# Altium footprint library texas.PCBLIB: 124 footprints (part 9 of 12)
Each footprint in its own frame and in the unit in brackets; x right, y up, seen from the top. Pads: shape width x height; smd on the part's side, far side on the other; paste and mask are expansions set on the pad; w line width, h text height; cw(c..) or ccw(c..) is an arc to the next point about the centre after c.
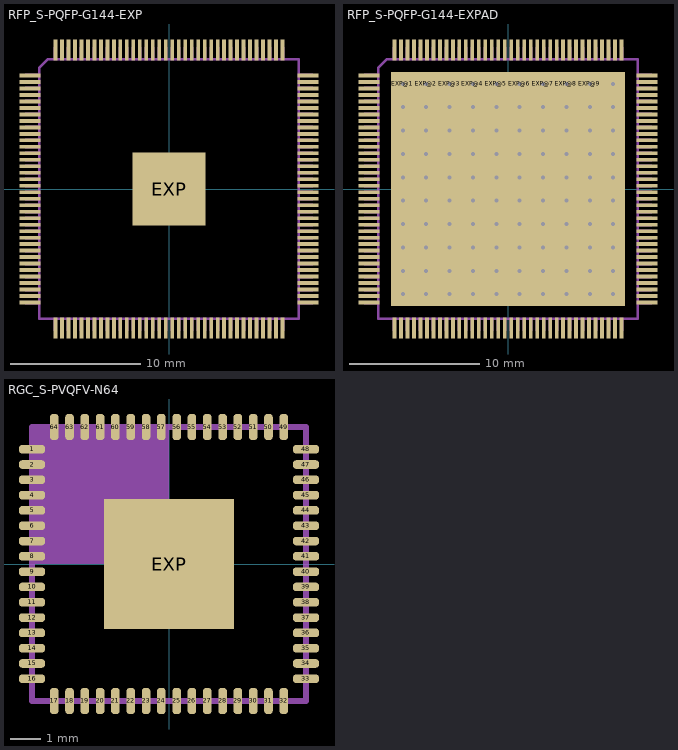
[diagram p8: the footprints below, top view; thin cyan lines are the x and y axes]

## RFP_S-PQFP-G144-EXP [mm]
pads (145):
  rect 1.6x0.3 smd paste-0.8 mask-0.8: 1(-10.7,8.75) 2(-10.7,8.25) 3(-10.7,7.75) 4(-10.7,7.25) 5(-10.7,6.75) 6(-10.7,6.25) 7(-10.7,5.75) 8(-10.7,5.25) 9(-10.7,4.75) 10(-10.7,4.25) 11(-10.7,3.75) 12(-10.7,3.25) 13(-10.7,2.75) 14(-10.7,2.25) 15(-10.7,1.75) 16(-10.7,1.25) 17(-10.7,0.75) 18(-10.7,0.25) 19(-10.7,-0.25) 20(-10.7,-0.75) 21(-10.7,-1.25) 22(-10.7,-1.75) 23(-10.7,-2.25) 24(-10.7,-2.75) 25(-10.7,-3.25) 26(-10.7,-3.75) 27(-10.7,-4.25) 28(-10.7,-4.75) 29(-10.7,-5.25) 30(-10.7,-5.75) 31(-10.7,-6.25) 32(-10.7,-6.75) 33(-10.7,-7.25) 34(-10.7,-7.75) 35(-10.7,-8.25) 36(-10.7,-8.75) 73(10.7,-8.75) 74(10.7,-8.25) 75(10.7,-7.75) 76(10.7,-7.25) 77(10.7,-6.75) 78(10.7,-6.25) 79(10.7,-5.75) 80(10.7,-5.25) 81(10.7,-4.75) 82(10.7,-4.25) 83(10.7,-3.75) 84(10.7,-3.25) 85(10.7,-2.75) 86(10.7,-2.25) 87(10.7,-1.75) 88(10.7,-1.25) 89(10.7,-0.75) 90(10.7,-0.25) 91(10.7,0.25) 92(10.7,0.75) 93(10.7,1.25) 94(10.7,1.75) 95(10.7,2.25) 96(10.7,2.75) 97(10.7,3.25) 98(10.7,3.75) 99(10.7,4.25) 100(10.7,4.75) 101(10.7,5.25) 102(10.7,5.75) 103(10.7,6.25) 104(10.7,6.75) 105(10.7,7.25) 106(10.7,7.75) 107(10.7,8.25) 108(10.7,8.75)
  rect 0.3x1.6 smd paste-0.8 mask-0.8: 37(-8.75,-10.7) 38(-8.25,-10.7) 39(-7.75,-10.7) 40(-7.25,-10.7) 41(-6.75,-10.7) 42(-6.25,-10.7) 43(-5.75,-10.7) 44(-5.25,-10.7) 45(-4.75,-10.7) 46(-4.25,-10.7) 47(-3.75,-10.7) 48(-3.25,-10.7) 49(-2.75,-10.7) 50(-2.25,-10.7) 51(-1.75,-10.7) 52(-1.25,-10.7) 53(-0.75,-10.7) 54(-0.25,-10.7) 55(0.25,-10.7) 56(0.75,-10.7) 57(1.25,-10.7) 58(1.75,-10.7) 59(2.25,-10.7) 60(2.75,-10.7) 61(3.25,-10.7) 62(3.75,-10.7) 63(4.25,-10.7) 64(4.75,-10.7) 65(5.25,-10.7) 66(5.75,-10.7) 67(6.25,-10.7) 68(6.75,-10.7) 69(7.25,-10.7) 70(7.75,-10.7) 71(8.25,-10.7) 72(8.75,-10.7) 109(8.75,10.7) 110(8.25,10.7) 111(7.75,10.7) 112(7.25,10.7) 113(6.75,10.7) 114(6.25,10.7) 115(5.75,10.7) 116(5.25,10.7) 117(4.75,10.7) 118(4.25,10.7) 119(3.75,10.7) 120(3.25,10.7) 121(2.75,10.7) 122(2.25,10.7) 123(1.75,10.7) 124(1.25,10.7) 125(0.75,10.7) 126(0.25,10.7) 127(-0.25,10.7) 128(-0.75,10.7) 129(-1.25,10.7) 130(-1.75,10.7) 131(-2.25,10.7) 132(-2.75,10.7) 133(-3.25,10.7) 134(-3.75,10.7) 135(-4.25,10.7) 136(-4.75,10.7) 137(-5.25,10.7) 138(-5.75,10.7) 139(-6.25,10.7) 140(-6.75,10.7) 141(-7.25,10.7) 142(-7.75,10.7) 143(-8.25,10.7) 144(-8.75,10.7)
  rect 5.61x5.61 smd paste-2.805 mask-2.805: EXP(0,0)
Top Paste:
  rectangle: -11.45,8.625 -9.95,8.875
  rectangle: -11.45,8.125 -9.95,8.375
  rectangle: -11.45,7.625 -9.95,7.875
  rectangle: -11.45,7.125 -9.95,7.375
  rectangle: -11.45,6.625 -9.95,6.875
  rectangle: -11.45,6.125 -9.95,6.375
  rectangle: -11.45,5.625 -9.95,5.875
  rectangle: -11.45,5.125 -9.95,5.375
  rectangle: -11.45,4.625 -9.95,4.875
  rectangle: -11.45,4.125 -9.95,4.375
  rectangle: -11.45,3.625 -9.95,3.875
  rectangle: -11.45,3.125 -9.95,3.375
  rectangle: -11.45,2.625 -9.95,2.875
  rectangle: -11.45,2.125 -9.95,2.375
  rectangle: -11.45,1.625 -9.95,1.875
  rectangle: -11.45,1.125 -9.95,1.375
  rectangle: -11.45,0.625 -9.95,0.875
  rectangle: -11.45,0.125 -9.95,0.375
  rectangle: -11.45,-0.375 -9.95,-0.125
  rectangle: -11.45,-0.875 -9.95,-0.625
  rectangle: -11.45,-1.375 -9.95,-1.125
  rectangle: -11.45,-1.875 -9.95,-1.625
  rectangle: -11.45,-2.375 -9.95,-2.125
  rectangle: -11.45,-2.875 -9.95,-2.625
  rectangle: -11.45,-3.375 -9.95,-3.125
  rectangle: -11.45,-3.875 -9.95,-3.625
  rectangle: -11.45,-4.375 -9.95,-4.125
  rectangle: -11.45,-4.875 -9.95,-4.625
  rectangle: -11.45,-5.375 -9.95,-5.125
  rectangle: -11.45,-5.875 -9.95,-5.625
  rectangle: -11.45,-6.375 -9.95,-6.125
  rectangle: -11.45,-6.875 -9.95,-6.625
  rectangle: -11.45,-7.375 -9.95,-7.125
  rectangle: -11.45,-7.875 -9.95,-7.625
  rectangle: -11.45,-8.375 -9.95,-8.125
  rectangle: -11.45,-8.875 -9.95,-8.625
  region: -8.625,-11.45 -8.625,-9.95 -8.875,-9.95 -8.875,-11.45
  region: -8.125,-11.45 -8.125,-9.95 -8.375,-9.95 -8.375,-11.45
  region: -7.625,-11.45 -7.625,-9.95 -7.875,-9.95 -7.875,-11.45
  region: -7.125,-11.45 -7.125,-9.95 -7.375,-9.95 -7.375,-11.45
  region: -6.625,-11.45 -6.625,-9.95 -6.875,-9.95 -6.875,-11.45
  region: -6.125,-11.45 -6.125,-9.95 -6.375,-9.95 -6.375,-11.45
  region: -5.625,-11.45 -5.625,-9.95 -5.875,-9.95 -5.875,-11.45
  region: -5.125,-11.45 -5.125,-9.95 -5.375,-9.95 -5.375,-11.45
  region: -4.625,-11.45 -4.625,-9.95 -4.875,-9.95 -4.875,-11.45
  region: -4.125,-11.45 -4.125,-9.95 -4.375,-9.95 -4.375,-11.45
  region: -3.625,-11.45 -3.625,-9.95 -3.875,-9.95 -3.875,-11.45
  region: -3.125,-11.45 -3.125,-9.95 -3.375,-9.95 -3.375,-11.45
  region: -2.625,-11.45 -2.625,-9.95 -2.875,-9.95 -2.875,-11.45
  region: -2.125,-11.45 -2.125,-9.95 -2.375,-9.95 -2.375,-11.45
  region: -1.625,-11.45 -1.625,-9.95 -1.875,-9.95 -1.875,-11.45
  region: -1.125,-11.45 -1.125,-9.95 -1.375,-9.95 -1.375,-11.45
  region: -0.625,-11.45 -0.625,-9.95 -0.875,-9.95 -0.875,-11.45
  region: -0.125,-11.45 -0.125,-9.95 -0.375,-9.95 -0.375,-11.45
  region: 0.375,-11.45 0.375,-9.95 0.125,-9.95 0.125,-11.45
  region: 0.875,-11.45 0.875,-9.95 0.625,-9.95 0.625,-11.45
  region: 1.375,-11.45 1.375,-9.95 1.125,-9.95 1.125,-11.45
  region: 1.875,-11.45 1.875,-9.95 1.625,-9.95 1.625,-11.45
  region: 2.375,-11.45 2.375,-9.95 2.125,-9.95 2.125,-11.45
  region: 2.875,-11.45 2.875,-9.95 2.625,-9.95 2.625,-11.45
  region: 3.375,-11.45 3.375,-9.95 3.125,-9.95 3.125,-11.45
  region: 3.875,-11.45 3.875,-9.95 3.625,-9.95 3.625,-11.45
  region: 4.375,-11.45 4.375,-9.95 4.125,-9.95 4.125,-11.45
  region: 4.875,-11.45 4.875,-9.95 4.625,-9.95 4.625,-11.45
  region: 5.375,-11.45 5.375,-9.95 5.125,-9.95 5.125,-11.45
  region: 5.875,-11.45 5.875,-9.95 5.625,-9.95 5.625,-11.45
  region: 6.375,-11.45 6.375,-9.95 6.125,-9.95 6.125,-11.45
  region: 6.875,-11.45 6.875,-9.95 6.625,-9.95 6.625,-11.45
  region: 7.375,-11.45 7.375,-9.95 7.125,-9.95 7.125,-11.45
  region: 7.875,-11.45 7.875,-9.95 7.625,-9.95 7.625,-11.45
  region: 8.375,-11.45 8.375,-9.95 8.125,-9.95 8.125,-11.45
  region: 8.875,-11.45 8.875,-9.95 8.625,-9.95 8.625,-11.45
  region: 11.45,-8.625 9.95,-8.625 9.95,-8.875 11.45,-8.875
  region: 11.45,-8.125 9.95,-8.125 9.95,-8.375 11.45,-8.375
  region: 11.45,-7.625 9.95,-7.625 9.95,-7.875 11.45,-7.875
  region: 11.45,-7.125 9.95,-7.125 9.95,-7.375 11.45,-7.375
  region: 11.45,-6.625 9.95,-6.625 9.95,-6.875 11.45,-6.875
  region: 11.45,-6.125 9.95,-6.125 9.95,-6.375 11.45,-6.375
  region: 11.45,-5.625 9.95,-5.625 9.95,-5.875 11.45,-5.875
  region: 11.45,-5.125 9.95,-5.125 9.95,-5.375 11.45,-5.375
  region: 11.45,-4.625 9.95,-4.625 9.95,-4.875 11.45,-4.875
  region: 11.45,-4.125 9.95,-4.125 9.95,-4.375 11.45,-4.375
  region: 11.45,-3.625 9.95,-3.625 9.95,-3.875 11.45,-3.875
  region: 11.45,-3.125 9.95,-3.125 9.95,-3.375 11.45,-3.375
  region: 11.45,-2.625 9.95,-2.625 9.95,-2.875 11.45,-2.875
  region: 11.45,-2.125 9.95,-2.125 9.95,-2.375 11.45,-2.375
  region: 11.45,-1.625 9.95,-1.625 9.95,-1.875 11.45,-1.875
  region: 11.45,-1.125 9.95,-1.125 9.95,-1.375 11.45,-1.375
  region: 11.45,-0.625 9.95,-0.625 9.95,-0.875 11.45,-0.875
  region: 11.45,-0.125 9.95,-0.125 9.95,-0.375 11.45,-0.375
  region: 11.45,0.375 9.95,0.375 9.95,0.125 11.45,0.125
  region: 11.45,0.875 9.95,0.875 9.95,0.625 11.45,0.625
  region: 11.45,1.375 9.95,1.375 9.95,1.125 11.45,1.125
  region: 11.45,1.875 9.95,1.875 9.95,1.625 11.45,1.625
  region: 11.45,2.375 9.95,2.375 9.95,2.125 11.45,2.125
  region: 11.45,2.875 9.95,2.875 9.95,2.625 11.45,2.625
  region: 11.45,3.375 9.95,3.375 9.95,3.125 11.45,3.125
  region: 11.45,3.875 9.95,3.875 9.95,3.625 11.45,3.625
  region: 11.45,4.375 9.95,4.375 9.95,4.125 11.45,4.125
  region: 11.45,4.875 9.95,4.875 9.95,4.625 11.45,4.625
  region: 11.45,5.375 9.95,5.375 9.95,5.125 11.45,5.125
  region: 11.45,5.875 9.95,5.875 9.95,5.625 11.45,5.625
  region: 11.45,6.375 9.95,6.375 9.95,6.125 11.45,6.125
  region: 11.45,6.875 9.95,6.875 9.95,6.625 11.45,6.625
  region: 11.45,7.375 9.95,7.375 9.95,7.125 11.45,7.125
  region: 11.45,7.875 9.95,7.875 9.95,7.625 11.45,7.625
  region: 11.45,8.375 9.95,8.375 9.95,8.125 11.45,8.125
  region: 11.45,8.875 9.95,8.875 9.95,8.625 11.45,8.625
  region: 8.625,11.45 8.625,9.95 8.875,9.95 8.875,11.45
  region: 8.125,11.45 8.125,9.95 8.375,9.95 8.375,11.45
  region: 7.625,11.45 7.625,9.95 7.875,9.95 7.875,11.45
  region: 7.125,11.45 7.125,9.95 7.375,9.95 7.375,11.45
  region: 6.625,11.45 6.625,9.95 6.875,9.95 6.875,11.45
  region: 6.125,11.45 6.125,9.95 6.375,9.95 6.375,11.45
  region: 5.625,11.45 5.625,9.95 5.875,9.95 5.875,11.45
  region: 5.125,11.45 5.125,9.95 5.375,9.95 5.375,11.45
  region: 4.625,11.45 4.625,9.95 4.875,9.95 4.875,11.45
  region: 4.125,11.45 4.125,9.95 4.375,9.95 4.375,11.45
  region: 3.625,11.45 3.625,9.95 3.875,9.95 3.875,11.45
  region: 3.125,11.45 3.125,9.95 3.375,9.95 3.375,11.45
  region: 2.625,11.45 2.625,9.95 2.875,9.95 2.875,11.45
  region: 2.125,11.45 2.125,9.95 2.375,9.95 2.375,11.45
  region: 1.625,11.45 1.625,9.95 1.875,9.95 1.875,11.45
  region: 1.125,11.45 1.125,9.95 1.375,9.95 1.375,11.45
  region: 0.625,11.45 0.625,9.95 0.875,9.95 0.875,11.45
  region: 0.125,11.45 0.125,9.95 0.375,9.95 0.375,11.45
  region: -0.375,11.45 -0.375,9.95 -0.125,9.95 -0.125,11.45
  region: -0.875,11.45 -0.875,9.95 -0.625,9.95 -0.625,11.45
  region: -1.375,11.45 -1.375,9.95 -1.125,9.95 -1.125,11.45
  region: -1.875,11.45 -1.875,9.95 -1.625,9.95 -1.625,11.45
  region: -2.375,11.45 -2.375,9.95 -2.125,9.95 -2.125,11.45
  region: -2.875,11.45 -2.875,9.95 -2.625,9.95 -2.625,11.45
  region: -3.375,11.45 -3.375,9.95 -3.125,9.95 -3.125,11.45
  region: -3.875,11.45 -3.875,9.95 -3.625,9.95 -3.625,11.45
  region: -4.375,11.45 -4.375,9.95 -4.125,9.95 -4.125,11.45
  region: -4.875,11.45 -4.875,9.95 -4.625,9.95 -4.625,11.45
  region: -5.375,11.45 -5.375,9.95 -5.125,9.95 -5.125,11.45
  region: -5.875,11.45 -5.875,9.95 -5.625,9.95 -5.625,11.45
  region: -6.375,11.45 -6.375,9.95 -6.125,9.95 -6.125,11.45
  region: -6.875,11.45 -6.875,9.95 -6.625,9.95 -6.625,11.45
  region: -7.375,11.45 -7.375,9.95 -7.125,9.95 -7.125,11.45
  region: -7.875,11.45 -7.875,9.95 -7.625,9.95 -7.625,11.45
  region: -8.375,11.45 -8.375,9.95 -8.125,9.95 -8.125,11.45
  region: -8.875,11.45 -8.875,9.95 -8.625,9.95 -8.625,11.45
  rectangle: -2.75,-2.75 2.75,2.775
Top Solder:
  rectangle: -11.55,8.575 -9.875,8.925
  rectangle: -11.55,8.075 -9.875,8.425
  rectangle: -11.55,7.575 -9.875,7.925
  rectangle: -11.55,7.075 -9.875,7.425
  rectangle: -11.55,6.575 -9.875,6.925
  rectangle: -11.55,6.075 -9.875,6.425
  rectangle: -11.55,5.575 -9.875,5.925
  rectangle: -11.55,5.075 -9.875,5.425
  rectangle: -11.55,4.575 -9.875,4.925
  rectangle: -11.55,4.075 -9.875,4.425
  rectangle: -11.55,3.575 -9.875,3.925
  rectangle: -11.55,3.075 -9.875,3.425
  rectangle: -11.55,2.575 -9.875,2.925
  rectangle: -11.55,2.075 -9.875,2.425
  rectangle: -11.55,1.575 -9.875,1.925
  rectangle: -11.55,1.075 -9.875,1.425
  rectangle: -11.55,0.575 -9.875,0.925
  rectangle: -11.55,0.075 -9.875,0.425
  rectangle: -11.55,-0.425 -9.875,-0.075
  rectangle: -11.55,-0.925 -9.875,-0.575
  rectangle: -11.55,-1.425 -9.875,-1.075
  rectangle: -11.55,-1.925 -9.875,-1.575
  rectangle: -11.55,-2.425 -9.875,-2.075
  rectangle: -11.55,-2.925 -9.875,-2.575
  rectangle: -11.55,-3.425 -9.875,-3.075
  rectangle: -11.55,-3.925 -9.875,-3.575
  rectangle: -11.55,-4.425 -9.875,-4.075
  rectangle: -11.55,-4.925 -9.875,-4.575
  rectangle: -11.55,-5.425 -9.875,-5.075
  rectangle: -11.55,-5.925 -9.875,-5.575
  rectangle: -11.55,-6.425 -9.875,-6.075
  rectangle: -11.55,-6.925 -9.875,-6.575
  rectangle: -11.55,-7.425 -9.875,-7.075
  rectangle: -11.55,-7.925 -9.875,-7.575
  rectangle: -11.55,-8.425 -9.875,-8.075
  rectangle: -11.55,-8.925 -9.875,-8.575
  region: -8.575,-11.55 -8.575,-9.875 -8.925,-9.875 -8.925,-11.55
  region: -8.075,-11.55 -8.075,-9.875 -8.425,-9.875 -8.425,-11.55
  region: -7.575,-11.55 -7.575,-9.875 -7.925,-9.875 -7.925,-11.55
  region: -7.075,-11.55 -7.075,-9.875 -7.425,-9.875 -7.425,-11.55
  region: -6.575,-11.55 -6.575,-9.875 -6.925,-9.875 -6.925,-11.55
  region: -6.075,-11.55 -6.075,-9.875 -6.425,-9.875 -6.425,-11.55
  region: -5.575,-11.55 -5.575,-9.875 -5.925,-9.875 -5.925,-11.55
  region: -5.075,-11.55 -5.075,-9.875 -5.425,-9.875 -5.425,-11.55
  region: -4.575,-11.55 -4.575,-9.875 -4.925,-9.875 -4.925,-11.55
  region: -4.075,-11.55 -4.075,-9.875 -4.425,-9.875 -4.425,-11.55
  region: -3.575,-11.55 -3.575,-9.875 -3.925,-9.875 -3.925,-11.55
  region: -3.075,-11.55 -3.075,-9.875 -3.425,-9.875 -3.425,-11.55
  region: -2.575,-11.55 -2.575,-9.875 -2.925,-9.875 -2.925,-11.55
  region: -2.075,-11.55 -2.075,-9.875 -2.425,-9.875 -2.425,-11.55
  region: -1.575,-11.55 -1.575,-9.875 -1.925,-9.875 -1.925,-11.55
  region: -1.075,-11.55 -1.075,-9.875 -1.425,-9.875 -1.425,-11.55
  region: -0.575,-11.55 -0.575,-9.875 -0.925,-9.875 -0.925,-11.55
  region: -0.075,-11.55 -0.075,-9.875 -0.425,-9.875 -0.425,-11.55
  region: 0.425,-11.55 0.425,-9.875 0.075,-9.875 0.075,-11.55
  region: 0.925,-11.55 0.925,-9.875 0.575,-9.875 0.575,-11.55
  region: 1.425,-11.55 1.425,-9.875 1.075,-9.875 1.075,-11.55
  region: 1.925,-11.55 1.925,-9.875 1.575,-9.875 1.575,-11.55
  region: 2.425,-11.55 2.425,-9.875 2.075,-9.875 2.075,-11.55
  region: 2.925,-11.55 2.925,-9.875 2.575,-9.875 2.575,-11.55
  region: 3.425,-11.55 3.425,-9.875 3.075,-9.875 3.075,-11.55
  region: 3.925,-11.55 3.925,-9.875 3.575,-9.875 3.575,-11.55
  region: 4.425,-11.55 4.425,-9.875 4.075,-9.875 4.075,-11.55
  region: 4.925,-11.55 4.925,-9.875 4.575,-9.875 4.575,-11.55
  region: 5.425,-11.55 5.425,-9.875 5.075,-9.875 5.075,-11.55
  region: 5.925,-11.55 5.925,-9.875 5.575,-9.875 5.575,-11.55
  region: 6.425,-11.55 6.425,-9.875 6.075,-9.875 6.075,-11.55
  region: 6.925,-11.55 6.925,-9.875 6.575,-9.875 6.575,-11.55
  region: 7.425,-11.55 7.425,-9.875 7.075,-9.875 7.075,-11.55
  region: 7.925,-11.55 7.925,-9.875 7.575,-9.875 7.575,-11.55
  region: 8.425,-11.55 8.425,-9.875 8.075,-9.875 8.075,-11.55
  region: 8.925,-11.55 8.925,-9.875 8.575,-9.875 8.575,-11.55
  region: 11.55,-8.575 9.875,-8.575 9.875,-8.925 11.55,-8.925
  region: 11.55,-8.075 9.875,-8.075 9.875,-8.425 11.55,-8.425
  region: 11.55,-7.575 9.875,-7.575 9.875,-7.925 11.55,-7.925
  region: 11.55,-7.075 9.875,-7.075 9.875,-7.425 11.55,-7.425
  region: 11.55,-6.575 9.875,-6.575 9.875,-6.925 11.55,-6.925
  region: 11.55,-6.075 9.875,-6.075 9.875,-6.425 11.55,-6.425
  region: 11.55,-5.575 9.875,-5.575 9.875,-5.925 11.55,-5.925
  region: 11.55,-5.075 9.875,-5.075 9.875,-5.425 11.55,-5.425
  region: 11.55,-4.575 9.875,-4.575 9.875,-4.925 11.55,-4.925
  region: 11.55,-4.075 9.875,-4.075 9.875,-4.425 11.55,-4.425
  region: 11.55,-3.575 9.875,-3.575 9.875,-3.925 11.55,-3.925
  region: 11.55,-3.075 9.875,-3.075 9.875,-3.425 11.55,-3.425
  region: 11.55,-2.575 9.875,-2.575 9.875,-2.925 11.55,-2.925
  region: 11.55,-2.075 9.875,-2.075 9.875,-2.425 11.55,-2.425
  region: 11.55,-1.575 9.875,-1.575 9.875,-1.925 11.55,-1.925
  region: 11.55,-1.075 9.875,-1.075 9.875,-1.425 11.55,-1.425
  region: 11.55,-0.575 9.875,-0.575 9.875,-0.925 11.55,-0.925
  region: 11.55,-0.075 9.875,-0.075 9.875,-0.425 11.55,-0.425
  region: 11.55,0.425 9.875,0.425 9.875,0.075 11.55,0.075
  region: 11.55,0.925 9.875,0.925 9.875,0.575 11.55,0.575
  region: 11.55,1.425 9.875,1.425 9.875,1.075 11.55,1.075
  region: 11.55,1.925 9.875,1.925 9.875,1.575 11.55,1.575
  region: 11.55,2.425 9.875,2.425 9.875,2.075 11.55,2.075
  region: 11.55,2.925 9.875,2.925 9.875,2.575 11.55,2.575
  region: 11.55,3.425 9.875,3.425 9.875,3.075 11.55,3.075
  region: 11.55,3.925 9.875,3.925 9.875,3.575 11.55,3.575
  region: 11.55,4.425 9.875,4.425 9.875,4.075 11.55,4.075
  region: 11.55,4.925 9.875,4.925 9.875,4.575 11.55,4.575
  region: 11.55,5.425 9.875,5.425 9.875,5.075 11.55,5.075
  region: 11.55,5.925 9.875,5.925 9.875,5.575 11.55,5.575
  region: 11.55,6.425 9.875,6.425 9.875,6.075 11.55,6.075
  region: 11.55,6.925 9.875,6.925 9.875,6.575 11.55,6.575
  region: 11.55,7.425 9.875,7.425 9.875,7.075 11.55,7.075
  region: 11.55,7.925 9.875,7.925 9.875,7.575 11.55,7.575
  region: 11.55,8.425 9.875,8.425 9.875,8.075 11.55,8.075
  region: 11.55,8.925 9.875,8.925 9.875,8.575 11.55,8.575
  region: 8.575,11.55 8.575,9.875 8.925,9.875 8.925,11.55
  region: 8.075,11.55 8.075,9.875 8.425,9.875 8.425,11.55
  region: 7.575,11.55 7.575,9.875 7.925,9.875 7.925,11.55
  region: 7.075,11.55 7.075,9.875 7.425,9.875 7.425,11.55
  region: 6.575,11.55 6.575,9.875 6.925,9.875 6.925,11.55
  region: 6.075,11.55 6.075,9.875 6.425,9.875 6.425,11.55
  region: 5.575,11.55 5.575,9.875 5.925,9.875 5.925,11.55
  region: 5.075,11.55 5.075,9.875 5.425,9.875 5.425,11.55
  region: 4.575,11.55 4.575,9.875 4.925,9.875 4.925,11.55
  region: 4.075,11.55 4.075,9.875 4.425,9.875 4.425,11.55
  region: 3.575,11.55 3.575,9.875 3.925,9.875 3.925,11.55
  region: 3.075,11.55 3.075,9.875 3.425,9.875 3.425,11.55
  region: 2.575,11.55 2.575,9.875 2.925,9.875 2.925,11.55
  region: 2.075,11.55 2.075,9.875 2.425,9.875 2.425,11.55
  region: 1.575,11.55 1.575,9.875 1.925,9.875 1.925,11.55
  region: 1.075,11.55 1.075,9.875 1.425,9.875 1.425,11.55
  region: 0.575,11.55 0.575,9.875 0.925,9.875 0.925,11.55
  region: 0.075,11.55 0.075,9.875 0.425,9.875 0.425,11.55
  region: -0.425,11.55 -0.425,9.875 -0.075,9.875 -0.075,11.55
  region: -0.925,11.55 -0.925,9.875 -0.575,9.875 -0.575,11.55
  region: -1.425,11.55 -1.425,9.875 -1.075,9.875 -1.075,11.55
  region: -1.925,11.55 -1.925,9.875 -1.575,9.875 -1.575,11.55
  region: -2.425,11.55 -2.425,9.875 -2.075,9.875 -2.075,11.55
  region: -2.925,11.55 -2.925,9.875 -2.575,9.875 -2.575,11.55
  region: -3.425,11.55 -3.425,9.875 -3.075,9.875 -3.075,11.55
  region: -3.925,11.55 -3.925,9.875 -3.575,9.875 -3.575,11.55
  region: -4.425,11.55 -4.425,9.875 -4.075,9.875 -4.075,11.55
  region: -4.925,11.55 -4.925,9.875 -4.575,9.875 -4.575,11.55
  region: -5.425,11.55 -5.425,9.875 -5.075,9.875 -5.075,11.55
  region: -5.925,11.55 -5.925,9.875 -5.575,9.875 -5.575,11.55
  region: -6.425,11.55 -6.425,9.875 -6.075,9.875 -6.075,11.55
  region: -6.925,11.55 -6.925,9.875 -6.575,9.875 -6.575,11.55
  region: -7.425,11.55 -7.425,9.875 -7.075,9.875 -7.075,11.55
  region: -7.925,11.55 -7.925,9.875 -7.575,9.875 -7.575,11.55
  region: -8.425,11.55 -8.425,9.875 -8.075,9.875 -8.075,11.55
  region: -8.925,11.55 -8.925,9.875 -8.575,9.875 -8.575,11.55
  rectangle: -2.9,-2.9 2.9,2.9
Mechanical 2:
  lines w0.203: -9.998,9.3 -9.3,9.998
Mechanical 18:
  drawing of 220 lines, arcs and shapes, not listed

## RFP_S-PQFP-G144-EXPAD [mm]
pads (244):
  rect 1.6x0.3 smd paste-0.8 mask-0.8: 1(-10.7,8.75) 2(-10.7,8.25) 3(-10.7,7.75) 4(-10.7,7.25) 5(-10.7,6.75) 6(-10.7,6.25) 7(-10.7,5.75) 8(-10.7,5.25) 9(-10.7,4.75) 10(-10.7,4.25) 11(-10.7,3.75) 12(-10.7,3.25) 13(-10.7,2.75) 14(-10.7,2.25) 15(-10.7,1.75) 16(-10.7,1.25) 17(-10.7,0.75) 18(-10.7,0.25) 19(-10.7,-0.25) 20(-10.7,-0.75) 21(-10.7,-1.25) 22(-10.7,-1.75) 23(-10.7,-2.25) 24(-10.7,-2.75) 25(-10.7,-3.25) 26(-10.7,-3.75) 27(-10.7,-4.25) 28(-10.7,-4.75) 29(-10.7,-5.25) 30(-10.7,-5.75) 31(-10.7,-6.25) 32(-10.7,-6.75) 33(-10.7,-7.25) 34(-10.7,-7.75) 35(-10.7,-8.25) 36(-10.7,-8.75) 73(10.7,-8.75) 74(10.7,-8.25) 75(10.7,-7.75) 76(10.7,-7.25) 77(10.7,-6.75) 78(10.7,-6.25) 79(10.7,-5.75) 80(10.7,-5.25) 81(10.7,-4.75) 82(10.7,-4.25) 83(10.7,-3.75) 84(10.7,-3.25) 85(10.7,-2.75) 86(10.7,-2.25) 87(10.7,-1.75) 88(10.7,-1.25) 89(10.7,-0.75) 90(10.7,-0.25) 91(10.7,0.25) 92(10.7,0.75) 93(10.7,1.25) 94(10.7,1.75) 95(10.7,2.25) 96(10.7,2.75) 97(10.7,3.25) 98(10.7,3.75) 99(10.7,4.25) 100(10.7,4.75) 101(10.7,5.25) 102(10.7,5.75) 103(10.7,6.25) 104(10.7,6.75) 105(10.7,7.25) 106(10.7,7.75) 107(10.7,8.25) 108(10.7,8.75)
  rect 0.3x1.6 smd paste-0.8 mask-0.8: 37(-8.75,-10.7) 38(-8.25,-10.7) 39(-7.75,-10.7) 40(-7.25,-10.7) 41(-6.75,-10.7) 42(-6.25,-10.7) 43(-5.75,-10.7) 44(-5.25,-10.7) 45(-4.75,-10.7) 46(-4.25,-10.7) 47(-3.75,-10.7) 48(-3.25,-10.7) 49(-2.75,-10.7) 50(-2.25,-10.7) 51(-1.75,-10.7) 52(-1.25,-10.7) 53(-0.75,-10.7) 54(-0.25,-10.7) 55(0.25,-10.7) 56(0.75,-10.7) 57(1.25,-10.7) 58(1.75,-10.7) 59(2.25,-10.7) 60(2.75,-10.7) 61(3.25,-10.7) 62(3.75,-10.7) 63(4.25,-10.7) 64(4.75,-10.7) 65(5.25,-10.7) 66(5.75,-10.7) 67(6.25,-10.7) 68(6.75,-10.7) 69(7.25,-10.7) 70(7.75,-10.7) 71(8.25,-10.7) 72(8.75,-10.7) 109(8.75,10.7) 110(8.25,10.7) 111(7.75,10.7) 112(7.25,10.7) 113(6.75,10.7) 114(6.25,10.7) 115(5.75,10.7) 116(5.25,10.7) 117(4.75,10.7) 118(4.25,10.7) 119(3.75,10.7) 120(3.25,10.7) 121(2.75,10.7) 122(2.25,10.7) 123(1.75,10.7) 124(1.25,10.7) 125(0.75,10.7) 126(0.25,10.7) 127(-0.25,10.7) 128(-0.75,10.7) 129(-1.25,10.7) 130(-1.75,10.7) 131(-2.25,10.7) 132(-2.75,10.7) 133(-3.25,10.7) 134(-3.75,10.7) 135(-4.25,10.7) 136(-4.75,10.7) 137(-5.25,10.7) 138(-5.75,10.7) 139(-6.25,10.7) 140(-6.75,10.7) 141(-7.25,10.7) 142(-7.75,10.7) 143(-8.25,10.7) 144(-8.75,10.7)
  rect 1.8x1.8 hole 0.3: EXP@1(-8.1,8.1) EXP@2(-6.3,8.1) EXP@3(-4.5,8.1) EXP@4(-2.7,8.1) EXP@5(-0.9,8.1) EXP@6(0.9,8.1) EXP@7(2.7,8.1) EXP@8(4.5,8.1) EXP@9(6.3,8.1) EXP@10(8.1,8.1) EXP@11(-8.1,6.3) EXP@12(-6.3,6.3) EXP@13(-4.5,6.3) EXP@14(-2.7,6.3) EXP@15(-0.9,6.3) EXP@16(0.9,6.3) EXP@17(2.7,6.3) EXP@18(4.5,6.3) EXP@19(6.3,6.3) EXP@20(8.1,6.3) EXP@21(-8.1,4.5) EXP@22(-6.3,4.5) EXP@23(-4.5,4.5) EXP@24(-2.7,4.5) EXP@25(-0.9,4.5) EXP@26(0.9,4.5) EXP@27(2.7,4.5) EXP@28(4.5,4.5) EXP@29(6.3,4.5) EXP@30(8.1,4.5) EXP@31(-8.1,2.7) EXP@32(-6.3,2.7) EXP@33(-4.5,2.7) EXP@34(-2.7,2.7) EXP@35(-0.9,2.7) EXP@36(0.9,2.7) EXP@37(2.7,2.7) EXP@38(4.5,2.7) EXP@39(6.3,2.7) EXP@40(8.1,2.7) EXP@41(-8.1,0.9) EXP@42(-6.3,0.9) EXP@43(-4.5,0.9) EXP@44(-2.7,0.9) EXP@45(-0.9,0.9) EXP@46(0.9,0.9) EXP@47(2.7,0.9) EXP@48(4.5,0.9) EXP@49(6.3,0.9) EXP@50(8.1,0.9) EXP@51(-8.1,-0.9) EXP@52(-6.3,-0.9) EXP@53(-4.5,-0.9) EXP@54(-2.7,-0.9) EXP@55(-0.9,-0.9) EXP@56(0.9,-0.9) EXP@57(2.7,-0.9) EXP@58(4.5,-0.9) EXP@59(6.3,-0.9) EXP@60(8.1,-0.9) EXP@61(-8.1,-2.7) EXP@62(-6.3,-2.7) EXP@63(-4.5,-2.7) EXP@64(-2.7,-2.7) EXP@65(-0.9,-2.7) EXP@66(0.9,-2.7) EXP@67(2.7,-2.7) EXP@68(4.5,-2.7) EXP@69(6.3,-2.7) EXP@70(8.1,-2.7) EXP@71(-8.1,-4.5) EXP@72(-6.3,-4.5) EXP@73(-4.5,-4.5) EXP@74(-2.7,-4.5) EXP@75(-0.9,-4.5) EXP@76(0.9,-4.5) EXP@77(2.7,-4.5) EXP@78(4.5,-4.5) EXP@79(6.3,-4.5) EXP@80(8.1,-4.5) EXP@81(-8.1,-6.3) EXP@82(-6.3,-6.3) EXP@83(-4.5,-6.3) EXP@84(-2.7,-6.3) EXP@85(-0.9,-6.3) EXP@86(0.9,-6.3) EXP@87(2.7,-6.3) EXP@88(4.5,-6.3) EXP@89(6.3,-6.3) EXP@90(8.1,-6.3) EXP@91(-8.1,-8.1) EXP@92(-6.3,-8.1) EXP@93(-4.5,-8.1) EXP@94(-2.7,-8.1) EXP@95(-0.9,-8.1) EXP@96(0.9,-8.1) EXP@97(2.7,-8.1) EXP@98(4.5,-8.1) EXP@99(6.3,-8.1) EXP@100(8.1,-8.1)